# Altium footprint library PcbLib1.PcbLib: 148 footprints (part 1 of 10)
Each footprint in its own frame and in the unit in brackets; x right, y up, seen from the top. Pads: shape width x height; smd on the part's side, far side on the other; paste and mask are expansions set on the pad; w line width, h text height; cw(c..) or ccw(c..) is an arc to the next point about the centre after c.
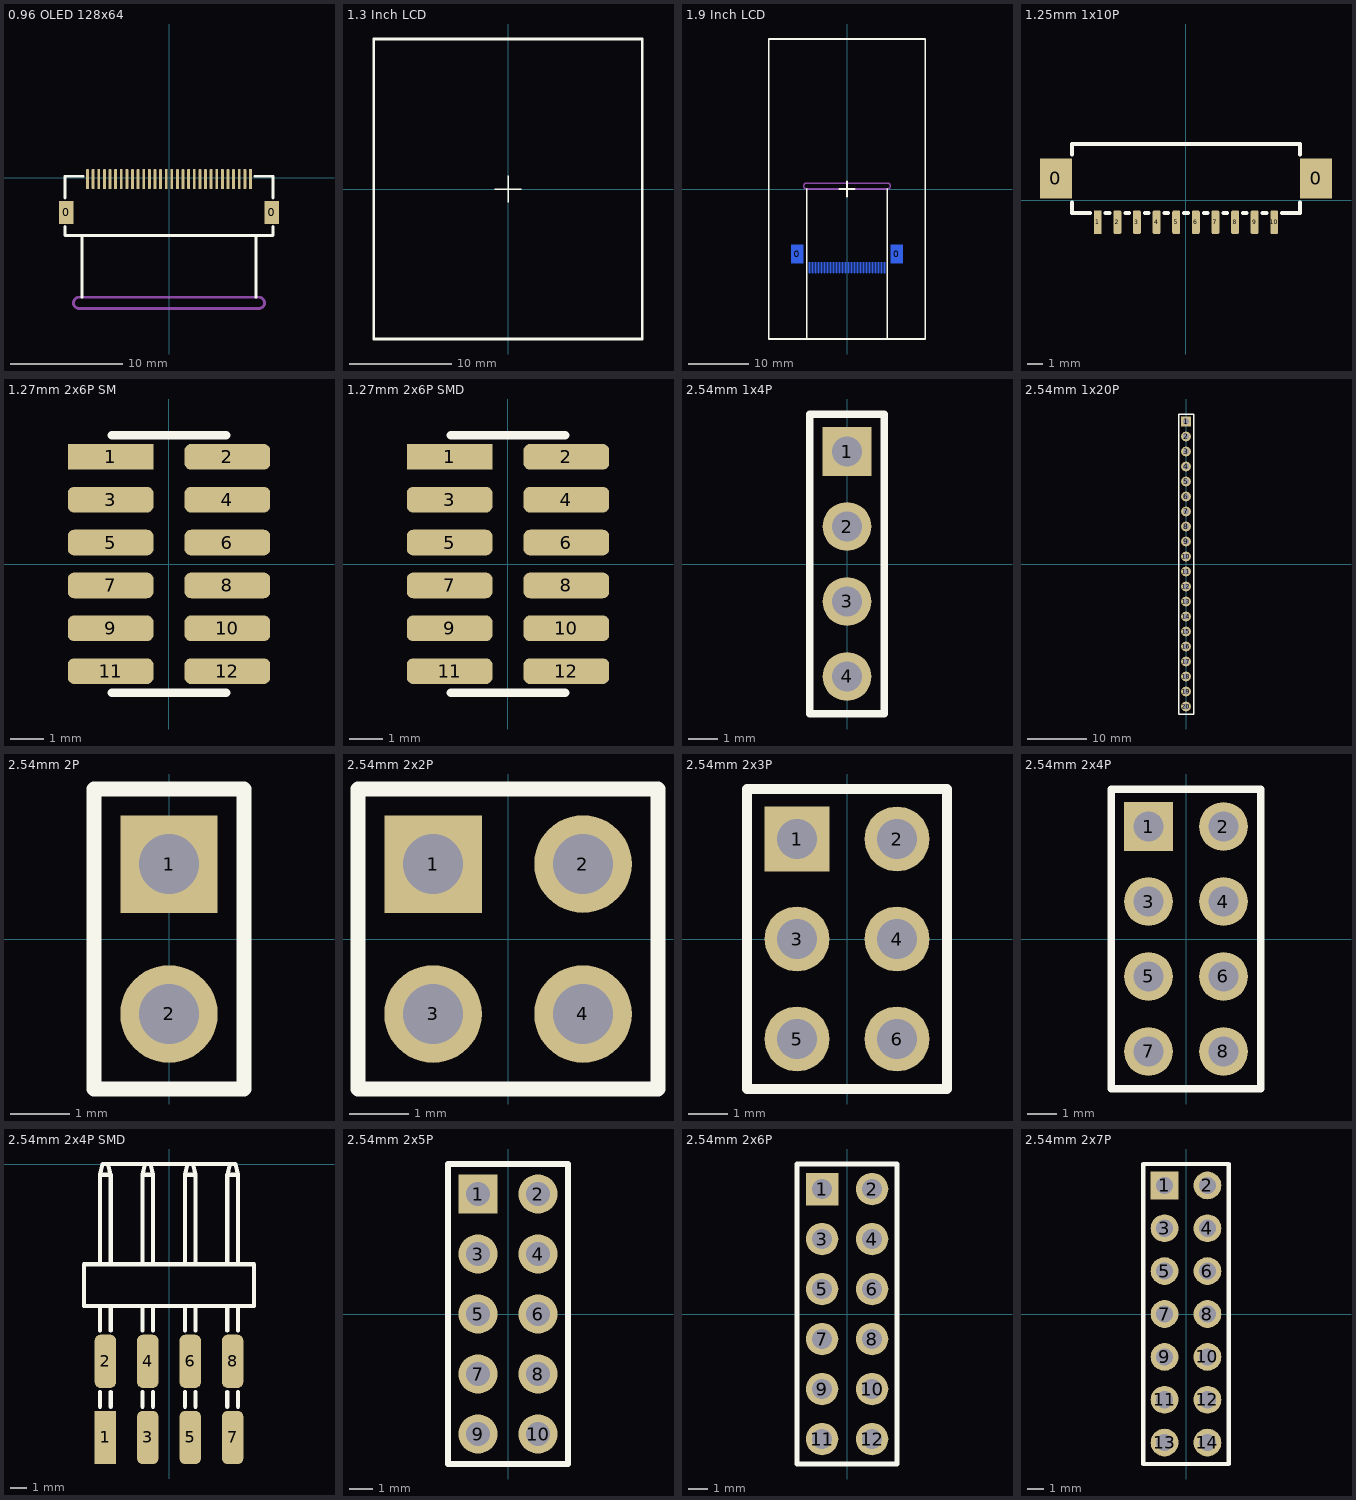
[diagram p0: the footprints below, top view; thin cyan lines are the x and y axes]

## 0.96 OLED 128x64 [mil]
pads (32):
  rect 50x80 smd: 0(-359.61,-121.26) 0(359.61,-121.26)
  rect 10x70 smd: 1(285.43,-4.88)
  rrect50% 10x70 smd: 2(265.75,-4.88) 3(246.06,-4.88) 4(226.38,-4.88) 5(206.69,-4.88) 6(187.01,-4.88) 7(167.32,-4.88) 8(147.64,-4.88) 9(127.95,-4.88) 10(108.27,-4.88) 11(88.58,-4.88) 12(68.9,-4.88) 13(49.21,-4.88) 14(29.53,-4.88) 15(9.84,-4.88) 16(-9.84,-4.88) 17(-29.53,-4.88) 18(-49.21,-4.88) 19(-68.9,-4.88) 20(-88.58,-4.88) 21(-108.27,-4.88) 22(-127.95,-4.88) 23(-147.64,-4.88) 24(-167.32,-4.88) 25(-187.01,-4.88) 26(-206.69,-4.88) 27(-226.38,-4.88) 28(-246.06,-4.88) 29(-265.75,-4.88) 30(-285.43,-4.88)
Top Overlay:
  lines w10: -364.17,-171.26 -364.17,-201.97 364.17,-201.97 364.17,-171.26 ; -364.17,-71.26 -364.17,5.12 -300.43,5.12 ; -305.12,-418.5 -305.12,-201.97 ; 300.43,5.12 364.17,5.12 364.17,-71.26 ; 305.12,-418.5 305.12,-201.97
Bottom Overlay:
  lines w5: -50,0 50,0 ; 0,-50 0,50
  lines w10: -525.59,-379.13 525.59,-379.13 525.59,379.13 -525.59,379.13 -525.59,-379.13
Mechanical 1:
  lines w10: -314.96,-457.87 cw(c-314.96,-438.19) -314.96,-418.5 314.96,-418.5 cw(c314.96,-438.19) 314.96,-457.87 -314.96,-457.87
3D body "X05A20H30T.stp": height 78.74, standoff 0, extent -364.17,-201.97 364.17,30.32

## 1.3 Inch LCD [mil]
Top Overlay:
  lines w5: -50,0 50,0 ; 0,-50 0,50
  lines w10: -514.96,-575.2 514.96,-575.2 514.96,575.2 -514.96,575.2 -514.96,-575.2

## 1.9 Inch LCD [mil]
pads (28):
  rect 80x120 smd far side: 0(-326.14,-428.19) 0(326.14,-428.19)
  rect 10x70 smd far side: 1(246.06,-517.56)
  rrect50% 10x70 smd far side: 2(226.38,-517.56) 3(206.69,-517.56) 4(187.01,-517.56) 5(167.32,-517.56) 6(147.64,-517.56) 7(127.95,-517.56) 8(108.27,-517.56) 9(88.58,-517.56) 10(68.9,-517.56) 11(49.21,-517.56) 12(29.53,-517.56) 13(9.84,-517.56) 14(-9.84,-517.56) 15(-29.53,-517.56) 16(-49.21,-517.56) 17(-68.9,-517.56) 18(-88.58,-517.56) 19(-108.27,-517.56) 20(-127.95,-517.56) 21(-147.64,-517.56) 22(-167.32,-517.56) 23(-187.01,-517.56) 24(-206.69,-517.56) 25(-226.38,-517.56) 26(-246.06,-517.56)
Top Overlay:
  lines w10: -265.75,-986.61 -265.75,0 ; -50,0 50,0 ; 0,-50 0,50 ; 265.75,-986.61 265.75,0 ; -515.75,-986.61 -515.75,986.61 515.75,986.61 515.75,-986.61 -515.75,-986.61
Bottom Overlay:
  lines w10: -366.14,-358.19 -366.14,-314.96 366.14,-314.96 366.14,-358.19 ; -276.14,-488.19 -261.06,-488.19 ; -265.75,-314.96 -265.75,0 ; 261.06,-488.19 276.14,-488.19 ; 265.75,-314.96 265.75,0
Mechanical 1:
  lines w10: -265.75,0 cw(c-265.75,19.68) -265.75,39.37 265.75,39.37 cw(c265.75,19.68) 265.75,0 -265.75,0

## 1.25mm 1x10P [mil] "卧贴"
pads (12):
  rect 80x100 smd: 0(-326.42,55.04) 0(326.42,55.04)
  rect 20x60 smd: 1(-221.46,-55.04)
  rrect50% 20x60 smd: 2(-172.24,-55.04) 3(-123.03,-55.04) 4(-73.82,-55.04) 5(-24.61,-55.04) 6(24.61,-55.04) 7(73.82,-55.04) 8(123.03,-55.04) 9(172.24,-55.04) 10(221.46,-55.04)
Top Overlay:
  lines w10: -286.42,-4.96 -286.42,-31.57 -241.46,-31.57 ; -286.42,115.04 -286.42,141.65 286.42,141.65 286.42,115.04 ; -201.46,-31.57 -192.24,-31.57 ; -152.24,-31.57 -143.03,-31.57 ; -103.03,-31.57 -93.82,-31.57 ; -53.82,-31.57 -44.61,-31.57 ; -4.61,-31.57 4.61,-31.57 ; 44.61,-31.57 53.82,-31.57 ; 93.82,-31.57 103.03,-31.57 ; 143.03,-31.57 152.24,-31.57 ; 192.24,-31.57 201.46,-31.57 ; 241.46,-31.57 286.42,-31.57 286.42,-4.96
3D body "X9821WRS-10-9TSN.stp": height 145.67, standoff 0, extent -347.64,-65.04 347.64,141.65

## 1.27mm 2x6P SM [mil]
pads (12):
  rect 100x30 smd: 1(-68.11,125)
  rrect50% 100x30 smd: 2(68.11,125) 3(-68.11,75) 4(68.11,75) 5(-68.11,25) 6(68.11,25) 7(-68.11,-25) 8(68.11,-25) 9(-68.11,-75) 10(68.11,-75) 11(-68.11,-125) 12(68.11,-125)
Top Overlay:
  lines w10: -66.93,-150 66.93,-150 ; -66.93,150 66.93,150

## 1.27mm 2x6P SMD [mil]
pads (12):
  rect 100x30 smd: 1(-68.11,125)
  rrect50% 100x30 smd: 2(68.11,125) 3(-68.11,75) 4(68.11,75) 5(-68.11,25) 6(68.11,25) 7(-68.11,-25) 8(68.11,-25) 9(-68.11,-75) 10(68.11,-75) 11(-68.11,-125) 12(68.11,-125)
Top Overlay:
  lines w10: -66.93,-150 66.93,-150 ; -66.93,150 66.93,150

## 2.54mm 1x4P [mil]
pads (4):
  rect 65x65 hole 40: 1(0,150)
  round 65 hole 40: 2(0,50) 3(0,-50) 4(0,-150)
Top Overlay:
  lines w10: -50,-200 50,-200 50,200 -50,200 -50,-200

## 2.54mm 1x20P [mil]
pads (20):
  rect 65x65 hole 40: 1(0,950)
  round 65 hole 40: 2(0,850) 3(0,750) 4(0,650) 5(0,550) 6(0,450) 7(0,350) 8(0,250) 9(0,150) 10(0,50) 11(0,-50) 12(0,-150) 13(0,-250) 14(0,-350) 15(0,-450) 16(0,-550) 17(0,-650) 18(0,-750) 19(0,-850) 20(0,-950)
Top Overlay:
  lines w10: -50,-1000 50,-1000 50,1000 -50,1000 -50,-1000

## 2.54mm 2P [mil]
pads (2):
  rect 65x65 hole 40: 1(0,50)
  round 65 hole 40: 2(0,-50)
Top Overlay:
  lines w10: -50,-100 50,-100 50,100 -50,100 -50,-100

## 2.54mm 2x2P [mil]
pads (4):
  rect 65x65 hole 40: 1(-50,50)
  round 65 hole 40: 2(50,50) 3(-50,-50) 4(50,-50)
Top Overlay:
  lines w10: -100,-100 100,-100 100,100 -100,100 -100,-100

## 2.54mm 2x3P [mil]
pads (6):
  rect 65x65 hole 40: 1(-50,100)
  round 65 hole 40: 2(50,100) 3(-50,0) 4(50,0) 5(-50,-100) 6(50,-100)
Top Overlay:
  lines w10: -100,-150 100,-150 100,150 -100,150 -100,-150

## 2.54mm 2x4P [mil]
pads (8):
  rect 65x65 hole 40: 1(-50,150)
  round 65 hole 40: 2(50,150) 3(-50,50) 4(50,50) 5(-50,-50) 6(50,-50) 7(-50,-150) 8(50,-150)
Top Overlay:
  lines w10: -100,-200 -100,200 100,200 100,-200 -100,-200

## 2.54mm 2x4P SMD [mm]
pads (8):
  rect 1.27x3.175 smd: 1(-3.81,-16.365)
  rrect50% 1.27x3.175 smd: 2(-3.81,-11.805) 3(-1.27,-16.365) 4(-1.27,-11.805) 5(1.27,-16.365) 6(1.27,-11.805) 7(3.81,-16.365) 8(3.81,-11.805)
Top Overlay:
  lines w0.254: -4.13,-14.523 -4.13,-13.646 ; -4.13,-9.963 -4.13,-8.5 ; -4.13,-6 -4.13,-0.64 ; -3.49,-14.523 -3.49,-13.646 ; -3.49,-9.963 -3.49,-8.5 ; -3.49,-6 -3.49,-0.64 ; -1.59,-14.523 -1.59,-13.646 ; -1.59,-9.963 -1.59,-8.5 ; -1.59,-6 -1.59,-0.64 ; -0.95,-14.523 -0.95,-13.646 ; -0.95,-9.963 -0.95,-8.5 ; -0.95,-6 -0.95,-0.64 ; 0.95,-14.523 0.95,-13.646 ; 0.95,-9.963 0.95,-8.5 ; 0.95,-6 0.95,-0.64 ; 1.59,-14.523 1.59,-13.646 ; 1.59,-9.963 1.59,-8.5 ; 1.59,-6 1.59,-0.64 ; 3.49,-14.523 3.49,-13.646 ; 3.49,-9.963 3.49,-8.5 ; 3.49,-6 3.49,-0.64 ; 4.13,-14.523 4.13,-13.646 ; 4.13,-9.963 4.13,-8.5 ; 4.13,-6 4.13,-0.64 ; -4.13,-0.64 -3.97,0 ; -4.13,-0.64 -3.49,-0.64 ; -3.97,0 -3.65,0 -3.49,-0.64 ; -3.97,0 3.97,0 ; -1.59,-0.64 -1.43,0 -1.11,0 -0.95,-0.64 ; -1.59,-0.64 -0.95,-0.64 ; 0.95,-0.64 1.11,0 1.43,0 1.59,-0.64 ; 0.95,-0.64 1.59,-0.64 ; 3.49,-0.64 3.65,0 3.97,0 ; 3.49,-0.64 4.13,-0.64 ; 3.97,0 4.13,-0.64 ; -5.08,-8.5 -5.08,-6 5.08,-6 5.08,-8.5 -5.08,-8.5

## 2.54mm 2x5P [mil]
pads (10):
  rect 65x65 hole 40: 1(-50,200)
  round 65 hole 40: 2(50,200) 3(-50,100) 4(50,100) 5(-50,0) 6(50,0) 7(-50,-100) 8(50,-100) 9(-50,-200) 10(50,-200)
Top Overlay:
  lines w10: -100,-250 100,-250 100,250 -100,250 -100,-250

## 2.54mm 2x6P [mil]
pads (12):
  rect 65x65 hole 40: 1(-50,250)
  round 65 hole 40: 2(50,250) 3(-50,150) 4(50,150) 5(-50,50) 6(50,50) 7(-50,-50) 8(50,-50) 9(-50,-150) 10(50,-150) 11(-50,-250) 12(50,-250)
Top Overlay:
  lines w10: -100,-300 -100,300 100,300 100,-300 -100,-300

## 2.54mm 2x7P [mil]
pads (14):
  rect 65x65 hole 40: 1(-50,300)
  round 65 hole 40: 2(50,300) 3(-50,200) 4(50,200) 5(-50,100) 6(50,100) 7(-50,0) 8(50,0) 9(-50,-100) 10(50,-100) 11(-50,-200) 12(50,-200) 13(-50,-300) 14(50,-300)
Top Overlay:
  lines w10: -100,-350 -100,350 100,350 100,-350 -100,-350